# Altium footprint library My_Intlib.PcbLib: 224 footprints (part 1 of 14)
Each footprint in its own frame and in the unit in brackets; x right, y up, seen from the top. Pads: shape width x height; smd on the part's side, far side on the other; paste and mask are expansions set on the pad; w line width, h text height; cw(c..) or ccw(c..) is an arc to the next point about the centre after c.
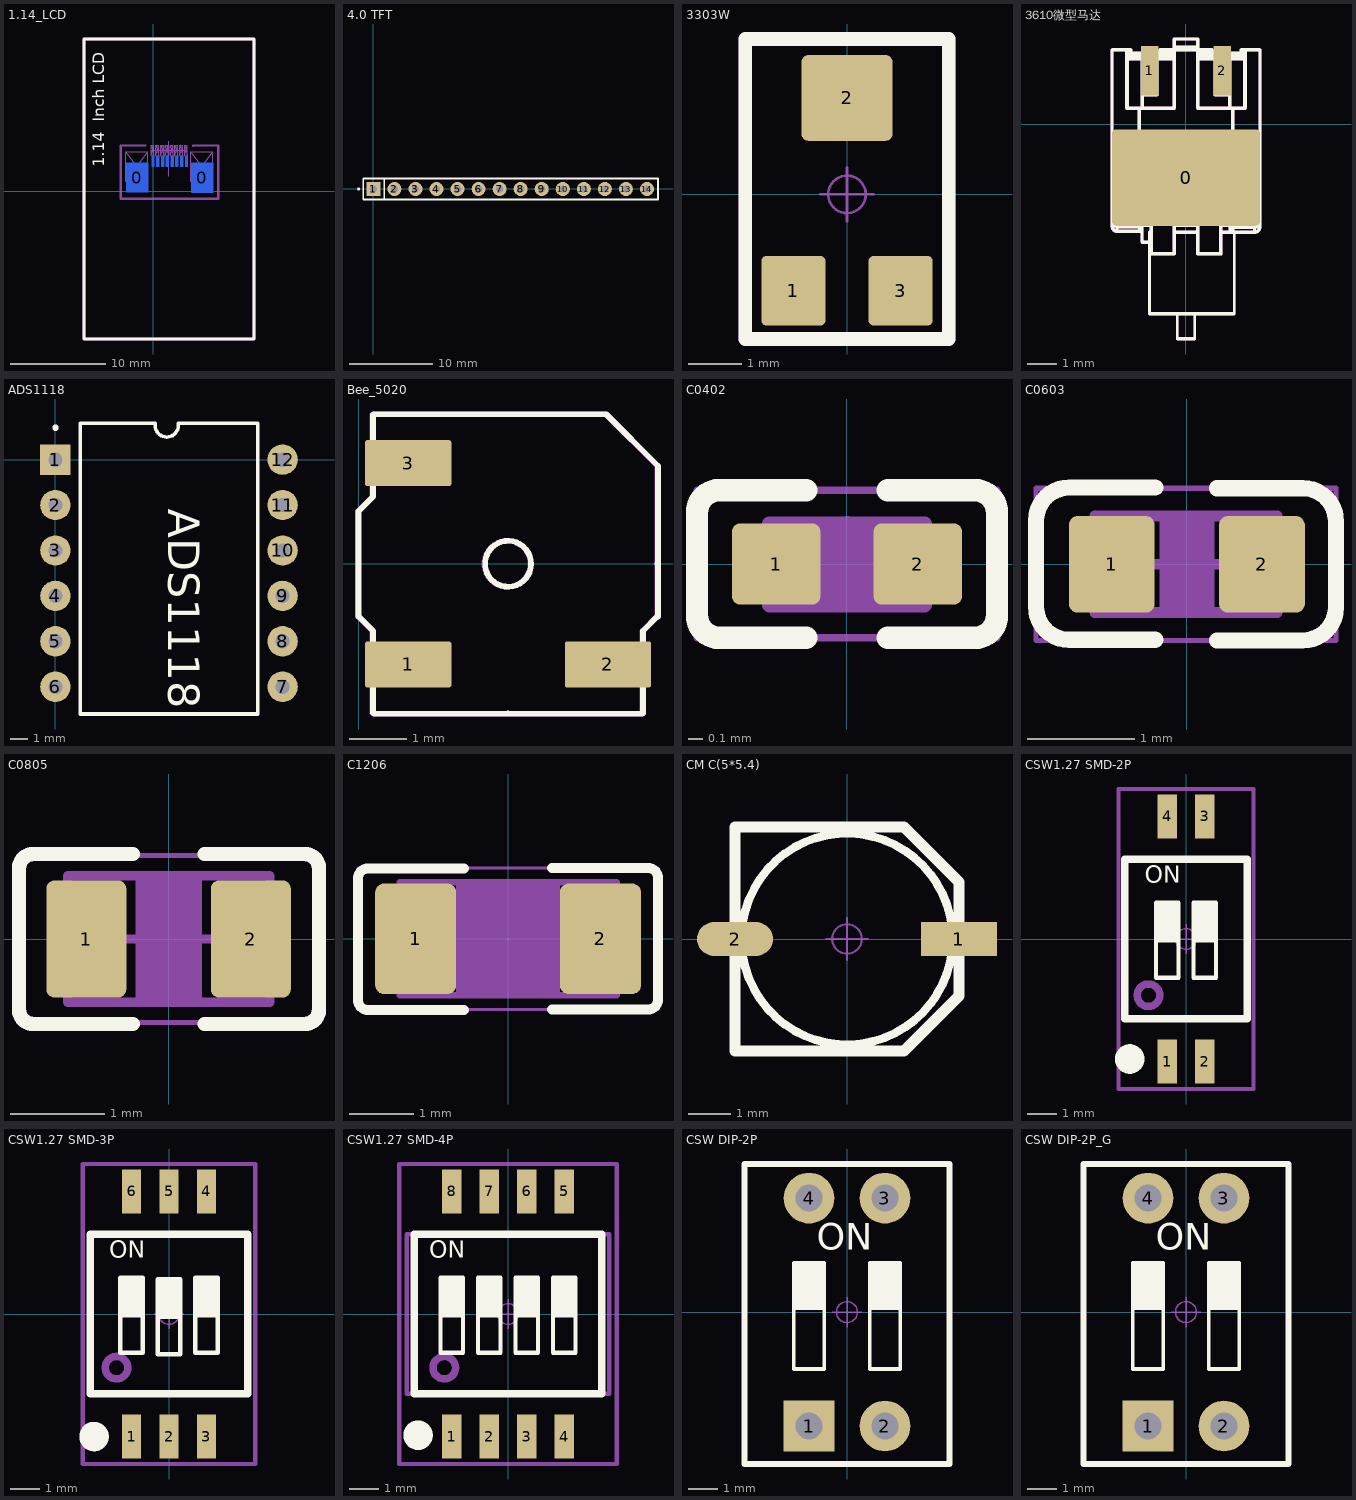
[diagram p0: the footprints below, top view; thin cyan lines are the x and y axes]

## 1.14_LCD [mm]
pads (10):
  rrect5% 2.3x3.1 smd far side mask+0.07: 0(-1.672,1.401) 0(5.172,1.396)
  rrect20% 0.3x1.1 smd far side mask+0.07: 1(0,3.099) 2(0.5,3.099) 3(1,3.099) 4(1.5,3.099) 5(2,3.099) 6(2.5,3.099) 7(3,3.099) 8(3.5,3.099)
Top Overlay:
  lines w0.305: -7.2,-15.469 10.544,-15.469 ; -7.2,-15.433 -7.2,15.9 10.544,15.9 10.544,-15.433
  text "1.14  Inch LCD" at -4.679,2.565 h2.03
Bottom Overlay:
  lines w0.254: -0.813,4.766 -3.353,4.766 -3.353,-0.822 6.807,-0.822 6.807,4.766 4.209,4.761
Top Value:
  text ".Comment" at 0.076,1.793 h0.89
Top Assembly:
  lines w0.254: -0.813,4.766 -3.353,4.766 -3.353,-0.822 6.807,-0.822 6.807,4.766 4.209,4.761
  lines w0.305: -7.2,-15.469 10.544,-15.469 ; -7.2,-15.433 -7.2,15.9 10.544,15.9 10.544,-15.433
  text ".Designator" at 0.076,2.586 h0.89
Mechanical 15:
  circle w0.006: c1.75,3.099 r0.003
  circle w0.006: c0,3.099 r0.003
  circle w0.006: c5.17,1.399 r0.003
  circle w0.006: c-1.67,1.399 r0.003
  lines w0.013: -0.201,4.258 3.599,4.258 ; 1.662,1.558 1.662,5.199 ; -2.871,1.008 -0.571,4.108 ; -2.871,1.008 -0.571,1.008 ; -2.871,1.008 -2.871,4.108 ; -2.871,4.108 -0.571,1.008 ; -2.871,4.108 -0.571,4.108 ; -0.571,1.008 -0.571,4.108 ; -0.201,3.708 0.099,3.708 ; -0.201,3.708 0.099,4.808 ; -0.201,3.708 -0.201,4.808 ; -0.201,4.808 0.099,4.808 ; -0.201,4.808 0.099,3.708 ; 0.099,3.708 0.099,4.808 ; 0.299,3.708 0.299,4.808 ; 0.299,3.708 0.599,4.808 ; 0.299,3.708 0.599,3.708 ; 0.299,4.808 0.599,3.708 ; 0.299,4.808 0.599,4.808 ; 0.599,3.708 0.599,4.808 ; 0.799,3.708 1.099,3.708 ; 0.799,3.708 1.099,4.808 ; 0.799,3.708 0.799,4.808 ; 0.799,4.808 1.099,4.808 ; 0.799,4.808 1.099,3.708 ; 1.099,3.708 1.099,4.808 ; 1.299,3.708 1.599,4.808 ; 1.299,3.708 1.599,3.708 ; 1.299,3.708 1.299,4.808 ; 1.299,4.808 1.599,4.808 ; 1.299,4.808 1.599,3.708 ; 1.599,3.708 1.599,4.808 ; 1.799,3.708 1.799,4.808 ; 1.799,3.708 2.099,3.708 ; 1.799,3.708 2.099,4.808 ; 1.799,4.808 2.099,4.808 ; 1.799,4.808 2.099,3.708 ; 2.099,3.708 2.099,4.808 ; 2.299,3.708 2.299,4.808 ; 2.299,3.708 2.599,4.808 ; 2.299,3.708 2.599,3.708 ; 2.299,4.808 2.599,4.808 ; 2.299,4.808 2.599,3.708 ; 2.599,3.708 2.599,4.808 ; 2.799,3.708 3.099,4.808 ; 2.799,3.708 3.099,3.708 ; 2.799,3.708 2.799,4.808 ; 2.799,4.808 3.099,3.708 ; 2.799,4.808 3.099,4.808 ; 3.099,3.708 3.099,4.808 ; 3.299,3.708 3.599,3.708 ; 3.299,3.708 3.299,4.808 ; 3.299,3.708 3.599,4.808 ; 3.299,4.808 3.599,3.708 ; 3.299,4.808 3.599,4.808 ; 3.599,3.708 3.599,4.808 ; 3.969,1.008 3.969,4.108 ; 3.969,1.008 6.269,4.108 ; 3.969,1.008 6.269,1.008 ; 3.969,4.108 6.269,4.108 ; 3.969,4.108 6.269,1.008 ; 6.269,1.008 6.269,4.108
3D body "1.14寸LCD.STEP": height 1.75, standoff -3.61, extent -7.198,-19.221 10.602,15.93

## 4.0 TFT [mm]
pads (14):
  rect 1.7x1.7 hole 0.9: 1(0,0)
  round 1.7 hole 0.9: 2(2.54,0) 3(5.08,0) 4(7.62,0) 5(10.16,0) 6(12.7,0) 7(15.24,0) 8(17.78,0) 9(20.32,0) 10(22.86,0) 11(25.4,0) 12(27.94,0) 13(30.48,0) 14(33.02,0)
Top Overlay:
  circle w0.203: c-1.778,0 r0.076
  lines w0.2: 1.313,-1.25 1.313,1.25 ; -1.206,-1.27 34.353,-1.27 34.353,1.27 0.699,1.27 -1.206,1.27 -1.206,-1.27
3D body "HDR2.54-1P.STEP": height 14.1, standoff 2.6, extent -1.143,-1.27 1.397,1.27
3D body "HDR2.54-1P.STEP": height 14.1, standoff 2.6, extent 6.477,-1.27 9.017,1.27
3D body "HDR2.54-1P.STEP": height 14.1, standoff 2.6, extent 3.937,-1.27 6.477,1.27
3D body "HDR2.54-1P.STEP": height 14.1, standoff 2.6, extent 14.097,-1.27 16.637,1.27
3D body "HDR2.54-1P.STEP": height 14.1, standoff 2.6, extent 11.557,-1.27 14.097,1.27
3D body "HDR2.54-1P.STEP": height 14.1, standoff 2.6, extent 19.177,-1.27 21.717,1.27
3D body "HDR2.54-1P.STEP": height 14.1, standoff 2.6, extent 21.717,-1.27 24.257,1.27
3D body "HDR2.54-1P.STEP": height 14.1, standoff 2.6, extent 24.257,-1.27 26.797,1.27
3D body "HDR2.54-1P.STEP": height 14.1, standoff 2.6, extent 31.877,-1.27 34.417,1.27
3D body "HDR2.54-1P.STEP": height 14.1, standoff 2.6, extent 29.337,-1.27 31.877,1.27
3D body "HDR2.54-1P.STEP": height 14.1, standoff 2.6, extent 1.397,-1.27 3.937,1.27
3D body "HDR2.54-1P.STEP": height 14.1, standoff 2.6, extent 9.017,-1.27 11.557,1.27
3D body "HDR2.54-1P.STEP": height 14.1, standoff 2.6, extent 16.637,-1.27 19.177,1.27
3D body "HDR2.54-1P.STEP": height 14.1, standoff 2.6, extent 26.797,-1.27 29.337,1.27
3D body "HDR2.54-1P_M.STEP": height 8.5, standoff -3, extent 19.177,-1.27 21.717,1.27
3D body "HDR2.54-1P_M.STEP": height 8.5, standoff -3, extent 16.637,-1.27 19.177,1.27
3D body "HDR2.54-1P_M.STEP": height 8.5, standoff -3, extent 14.097,-1.27 16.637,1.27
3D body "HDR2.54-1P_M.STEP": height 8.5, standoff -3, extent 11.557,-1.27 14.097,1.27
3D body "HDR2.54-1P_M.STEP": height 8.5, standoff -3, extent 9.017,-1.27 11.557,1.27
3D body "HDR2.54-1P_M.STEP": height 8.5, standoff -3, extent 6.477,-1.27 9.017,1.27
3D body "HDR2.54-1P_M.STEP": height 8.5, standoff -3, extent 3.937,-1.27 6.477,1.27
3D body "HDR2.54-1P_M.STEP": height 8.5, standoff -3, extent 1.397,-1.27 3.937,1.27
3D body "HDR2.54-1P_M.STEP": height 8.5, standoff -3, extent -1.143,-1.27 1.397,1.27
3D body "HDR2.54-1P_M.STEP": height 8.5, standoff -3, extent 21.717,-1.27 24.257,1.27
3D body "HDR2.54-1P_M.STEP": height 8.5, standoff -3, extent 24.257,-1.27 26.797,1.27
3D body "HDR2.54-1P_M.STEP": height 8.5, standoff -3, extent 26.797,-1.27 29.337,1.27
3D body "HDR2.54-1P_M.STEP": height 8.5, standoff -3, extent 29.337,-1.27 31.877,1.27
3D body "HDR2.54-1P_M.STEP": height 8.5, standoff -3, extent 31.877,-1.27 34.417,1.27
3D body "1.STEP": height 15.46, standoff 11.36, extent -14.182,-106.135 47.558,1.905

## 3303W [mm] "3.5*3.1*1.5mm"
pads (3):
  rrect15% 1.2x1.3 smd: 1(-1,-1.8) 3(1,-1.8)
  rrect15% 1.7x1.6 smd: 2(0,1.8)
Top Overlay:
  lines w0.254: -1.9,-2.7 -1.9,2.9 1.9,2.9 1.9,-2.7 -1.9,-2.7
Top Value:
  text ".Comment" at 2.718,-0.635 h0.89
Top Assembly:
  lines w0.254: -1.9,-2.7 -1.9,2.9 1.9,2.9 1.9,-2.7 -1.9,-2.7
  text ".Designator" at 2.692,0.305 h0.89
Mechanical 15:
  circle w0.05: c0,0 r0.35
  lines w0.05: -0.5,0 0.5,0 ; 0,-0.5 0,0.5
3D body "3303W.STEP": height 1.45, standoff -0.01, extent -1.55,-2.055 1.55,2.05

## 3610微型马达 [mm] "3610微型马达，10.6mm*4.4mm*3.5mm"
pads (3):
  rrect10% 5.08x3.302 smd: 0(0,-1.826)
  rrect10% 0.6x1.7 smd: 1(-1.24,1.826) 2(1.24,1.826)
Top Overlay:
  drawing of 2290 lines, arcs and shapes, not listed
Top Value:
  text ".Comment" at 2.769,-0.024 h0.89
Top Assembly:
  text ".Designator" at 2.769,0.769 h0.89
Mechanical 15:
  drawing of 2290 lines, arcs and shapes, not listed
3D body "3610微型马达.STEP": height 3.87, standoff 0.02, extent -2.528,-7.363 2.54,2.903

## ADS1118 [mm]
pads (12):
  rect 1.7x1.7 hole 0.8: 1(0,0)
  round 1.7 hole 0.8: 2(0,-2.54) 3(0,-5.08) 4(0,-7.62) 5(0,-10.16) 6(0,-12.7) 7(12.7,-12.7) 8(12.7,-10.16) 9(12.7,-7.62) 10(12.7,-5.08) 11(12.7,-2.54) 12(12.7,0)
Top Overlay:
  circle w0.203: c0,1.778 r0.076
  lines w0.2: 5.588,2.016 ccw(c6.223,1.905) 6.858,2.016 ; 5.588,2.042 1.397,2.042 1.397,-14.224 11.303,-14.224 11.303,2.031 6.858,2.031
  text "ADS1118" at 5.715,-2.751 h3
3D body "HDR2.54-1P_M.STEP": height 8.5, standoff -3, extent 11.43,-8.89 13.97,-6.35
3D body "HDR2.54-1P_M.STEP": height 8.5, standoff -3, extent 11.43,-13.97 13.97,-11.43
3D body "HDR2.54-1P_M.STEP": height 8.5, standoff -3, extent 11.43,-11.43 13.97,-8.89
3D body "HDR2.54-1P_M.STEP": height 8.5, standoff -3, extent 11.43,-1.27 13.97,1.27
3D body "HDR2.54-1P_M.STEP": height 8.5, standoff -3, extent 11.43,-6.35 13.97,-3.81
3D body "HDR2.54-1P_M.STEP": height 8.5, standoff -3, extent 11.43,-3.81 13.97,-1.27
3D body "HDR2.54-1P_M.STEP": height 8.5, standoff -3, extent -1.27,-8.89 1.27,-6.35
3D body "HDR2.54-1P_M.STEP": height 8.5, standoff -3, extent -1.27,-13.97 1.27,-11.43
3D body "HDR2.54-1P_M.STEP": height 8.5, standoff -3, extent -1.27,-11.43 1.27,-8.89
3D body "HDR2.54-1P_M.STEP": height 8.5, standoff -3, extent -1.27,-1.27 1.27,1.27
3D body "HDR2.54-1P_M.STEP": height 8.5, standoff -3, extent -1.27,-6.35 1.27,-3.81
3D body "HDR2.54-1P_M.STEP": height 8.5, standoff -3, extent -1.27,-3.81 1.27,-1.27

## Bee_5020 [mm]
pads (3):
  rrect10% 1.5x0.8 smd mask+0.102: 1(0.864,-1.75) 2(4.336,-1.75) 3(0.864,1.75)
Top Overlay:
  circle w0.1: c0.711,-1.753 r0.227
  circle w0.1: c2.6,0 r0.4
  region: 0.484,-1.753 0.484,-1.798 0.519,-1.881 0.583,-1.945 0.666,-1.98 0.711,-1.98 0.756,-1.98 0.84,-1.945 0.904,-1.881 0.938,-1.798 0.938,-1.753 0.938,-1.707 0.904,-1.624 0.84,-1.56 0.756,-1.525 0.711,-1.525 0.666,-1.525 0.583,-1.56 0.519,-1.624 0.484,-1.707
  lines w0.102: 0.254,2.591 0.254,1.168 0,0.914 0,-0.914 0.254,-1.168 0.254,-2.591 0.27,-2.607 1.693,-2.607 4.937,-2.607 4.946,-2.598 4.946,-1.168 5.2,-0.914 ; 0.263,2.6 4.309,2.6 5.207,1.702 5.207,-0.914 ; 2.6,-2.6 2.607,-2.607 ; 5.2,0 5.207,-0.007
Top Value:
  text ".Comment" at 2.134,0.024 h0.89
Top Assembly:
  circle w0.1: c0.702,-1.753 r0.227
  circle w0.1: c2.591,0 r0.4
  region: 0.475,-1.753 0.475,-1.798 0.509,-1.881 0.573,-1.945 0.657,-1.98 0.702,-1.98 0.747,-1.98 0.831,-1.945 0.895,-1.881 0.929,-1.798 0.929,-1.753 0.929,-1.707 0.895,-1.624 0.831,-1.56 0.747,-1.525 0.702,-1.525 0.657,-1.525 0.573,-1.56 0.509,-1.624 0.475,-1.707
  lines w0.102: 0.245,2.591 0.245,1.168 -0.009,0.914 -0.009,-0.914 0.245,-1.168 0.245,-2.591 0.261,-2.607 1.683,-2.607 4.928,-2.607 4.937,-2.598 4.937,-1.168 5.191,-0.914 ; 0.254,2.6 4.3,2.6 5.198,1.702 5.198,-0.914 ; 2.591,-2.6 2.598,-2.607 ; 5.191,0 5.198,-0.007
  text ".Designator" at 2.134,0.818 h0.89
3D body "User Library-BEEP-5020.step": height 2.1, standoff 0, extent 0.016,-2.625 5.216,2.575

## C0402 [mm]
pads (2):
  rrect20% 0.6x0.55 smd mask+0.051: 1(-0.48,0) 2(0.48,0)
Top Overlay:
  lines w0.152: -0.275,-0.5 -0.864,-0.5 cw(c-0.864,-0.348) -1.016,-0.348 -1.016,0.348 cw(c-0.864,0.348) -0.864,0.5 -0.275,0.5 ; 0.275,-0.5 0.864,-0.5 ccw(c0.864,-0.348) 1.016,-0.348 1.016,0.348 ccw(c0.864,0.348) 0.864,0.5 0.275,0.5
Mechanical 1:
  pour cut-out: -0.254,0.272 0.254,0.272 0.254,-0.278 -0.254,-0.278
Top Value:
  text ".Comment" at -0.5,-0.762 h0.76
Top Assembly:
  lines w0.1: -0.525,-0.278 0.525,-0.278 0.525,0.272 -0.525,0.272 -0.525,-0.278
  text ".Designator" at -0.525,-0.22 h0.76
Mechanical 15:
  lines w0.05: -1.016,-0.5 -1.016,0.5 1.016,0.5 1.016,-0.5 -1.016,-0.5
  lines w0.1: -0.275,0 0.275,0 ; 0,-0.275 0,0.275
3D body "C0402.stp": height 0.56, standoff 0.01, extent -0.5,-0.25 0.5,0.25

## C0603 [mm]
pads (2):
  rrect20% 0.8x0.9 smd: 1(-0.7,0) 2(0.7,0)
Top Overlay:
  lines w0.152: -0.296,-0.704 -1.096,-0.704 cw(c-1.096,-0.394) -1.406,-0.394 -1.405,0.406 cw(c-1.096,0.406) -1.096,0.715 -0.296,0.715 ; 0.28,-0.71 1.08,-0.71 ccw(c1.08,-0.4) 1.39,-0.4 1.39,0.4 ccw(c1.08,0.4) 1.08,0.71 0.28,0.71
Mechanical 1:
  pour cut-out: -0.254,0.45 0.254,0.45 0.254,-0.45 -0.254,-0.45
Top Value:
  text ".Comment" at -0.45,-1.144 h0.89
Top Assembly:
  lines w0.1: -0.858,-0.45 -0.858,0.45 0.842,0.45 0.842,-0.45 -0.858,-0.45
  text ".Designator" at -0.45,-0.275 h0.89
Mechanical 15:
  lines w0.05: -1.405,-0.71 1.39,-0.71 1.39,0.71 -1.405,0.71 -1.405,-0.71
  lines w0.1: -0.45,0 0.45,0 ; 0,-0.45 0,0.45
3D body "C0603.stp": height 0.9, standoff 0, extent -0.808,-0.399 0.792,0.401

## C0805 [mm]
pads (2):
  rrect20% 0.85x1.25 smd: 1(-0.875,0) 2(0.875,0)
Top Overlay:
  lines w0.152: -0.381,-0.904 -1.439,-0.904 cw(c-1.439,-0.751) -1.592,-0.751 -1.592,0.751 cw(c-1.439,0.751) -1.439,0.904 -0.381,0.904 ; 0.381,-0.904 1.422,-0.904 ; 0.381,0.904 1.456,0.904 ; 1.448,-0.904 ccw(c1.448,-0.751) 1.6,-0.751 1.6,0.751 ccw(c1.448,0.751) 1.448,0.904
Mechanical 1:
  pour cut-out: -0.351,0.675 0.353,0.675 0.353,-0.675 -0.351,-0.675
Top Value:
  text ".Comment" at -0.762,-1.144 h0.89
Top Assembly:
  lines w0.1: -1.075,-0.675 -1.075,0.675 1.075,0.675 1.075,-0.675 -1.075,-0.675
  text ".Designator" at -0.762,-0.275 h0.89
Mechanical 15:
  lines w0.05: 1.6,-0.889 -1.592,-0.889 -1.592,0.889 1.6,0.889 1.6,-0.864
  lines w0.1: -0.5,0 0.5,0 ; 0,-0.5 0,0.5
3D body "C0805.stp": height 1.41, standoff 0.01, extent -1,-0.623 1,0.627

## C1206 [mm]
pads (2):
  rrect20% 1.25x1.7 smd mask+0.102: 1(-1.425,0) 2(1.425,0)
Top Overlay:
  lines w0.152: -0.678,-1.1 -2.163,-1.1 cw(c-2.163,-0.948) -2.316,-0.948 -2.316,0.933 cw(c-2.163,0.933) -2.163,1.085 -0.678,1.085 ; 0.676,-1.093 2.161,-1.093 ccw(c2.161,-0.94) 2.314,-0.94 2.314,0.94 ccw(c2.161,0.94) 2.161,1.093 0.676,1.093
Mechanical 1:
  pour cut-out: -0.8,0.875 0.8,0.875 0.8,-0.875 -0.8,-0.875
Top Value:
  text ".Comment" at -1.016,-1.144 h0.89
Top Assembly:
  lines w0.1: -1.675,-0.875 1.675,-0.875 1.675,0.875 -1.675,0.875 -1.675,-0.875
  text ".Designator" at -1.016,-0.275 h0.89
Mechanical 15:
  lines w0.05: -2.316,1.085 -2.316,-1.093 2.314,-1.093 2.314,1.093 -2.316,1.093
  lines w0.1: -0.5,0 0.5,0 ; 0,-0.5 0,0.5
3D body "C1206.stp": height 1.8, standoff 0, extent -1.6,-0.802 1.6,0.798

## CM C(5*5.4) [mm] "贴片电解电容，直径5mm，高5.4mm"
pads (2):
  rect 1.8x0.8 smd: 1(2.65,0)
  oval 1.8x0.8 smd: 2(-2.65,0)
Top Overlay:
  circle w0.2: c0,0 r2.5
  lines w0.254: -2.65,-2.65 1.35,-2.65 2.65,-1.35 2.65,1.35 1.35,2.65 -2.65,2.65 -2.65,-2.65
Mechanical 15:
  circle w0.05: c0,0 r0.35
  lines w0.05: -0.5,0 0.5,0 ; 0,-0.5 0,0.5
3D body "CM C(5X5.4).STEP": height 5.4, standoff -0.01, extent -2.95,-2.65 2.95,2.65

## CSW1.27 SMD-2P [mm] "长：4.14mm，宽：5.4mm，高：2.3mm"
pads (4):
  rect 0.65x1.5 smd: 1(-0.635,-4.15) 2(0.635,-4.15) 3(0.635,4.15) 4(-0.635,4.15)
Top Overlay:
  circle w0.5: c-1.905,-4.064 r0.25
  region: -0.254,1.225 -1.016,1.225 -1.016,-0.045 -0.254,-0.045
  region: 1.016,1.225 0.254,1.225 0.254,-0.045 1.016,-0.045
  lines w0.15: -1.016,-0.045 -0.254,-0.045 ; 0.254,-0.045 1.016,-0.045 ; -1.016,-1.315 -0.254,-1.315 -0.254,1.225 -1.016,1.225 -1.016,-1.315 ; 0.254,-1.315 1.016,-1.315 1.016,1.225 0.254,1.225 0.254,-1.315
  lines w0.254: -2.07,-2.7 -2.07,2.7 2.07,2.7 2.07,-2.7 -2.07,-2.7
  text "ON" at -1.397,1.696 h1
Mechanical 13:
  circle w0.254: c-1.27,-1.905 r0.381
  lines w0.15: -2.032,-2.7 2.032,-2.7 2.032,2.7 -2.032,2.7 -2.032,-2.7
Mechanical 15:
  circle w0.05: c0,0 r0.35
  lines w0.05: -0.5,0 0.5,0 ; 0,-0.5 0,0.5
  lines w0.15: -2.286,-5.08 2.159,-5.08 2.286,-5.08 2.286,5.08 -2.286,5.08 -2.286,-5.08
3D body "CSW1.27-SMD-2P.STEP": height 2.35, standoff 0, extent -2.07,-4.35 2.07,4.35

## CSW1.27 SMD-3P [mm] "长：5.41mm，宽：5.4mm，高：2.3mm"
pads (6):
  rect 0.65x1.5 smd: 1(-1.27,-4.15) 2(0,-4.15) 3(1.27,-4.15) 4(1.27,4.15) 5(0,4.15) 6(-1.27,4.15)
Top Overlay:
  circle w0.5: c-2.54,-4.15 r0.25
  region: 1.651,1.225 0.889,1.225 0.889,-0.045 1.651,-0.045
  region: 0.381,1.184 -0.381,1.184 -0.381,-0.086 0.381,-0.086
  region: -0.889,1.225 -1.651,1.225 -1.651,-0.045 -0.889,-0.045
  lines w0.15: -1.651,-0.045 -0.889,-0.045 ; -0.381,-0.086 0.381,-0.086 ; 0.889,-0.045 1.651,-0.045 ; -1.651,-1.315 -1.651,1.225 -0.889,1.225 -0.889,-1.315 -1.651,-1.315 ; -0.381,-1.356 -0.381,1.184 0.381,1.184 0.381,-1.356 -0.381,-1.356 ; 0.889,-1.315 0.889,1.225 1.651,1.225 1.651,-1.315 0.889,-1.315
  lines w0.254: -2.667,-2.7 2.667,-2.7 2.667,2.7 -2.667,2.7 -2.667,-2.7
  text "ON" at -2.032,1.696 h1
Mechanical 13:
  circle w0.254: c-1.778,-1.819 r0.381
  lines w0.15: -2.667,-2.7 -2.667,2.7 2.705,2.7 2.705,-2.7 -2.667,-2.7
Mechanical 15:
  circle w0.05: c0,0 r0.35
  lines w0.05: -0.5,0 0.5,0 ; 0,-0.5 0,0.5
  lines w0.15: -2.921,-5.08 -2.921,5.08 2.921,5.08 2.921,-5.08 2.159,-5.08 -2.921,-5.08
3D body "CSW1.27-SMD-3P.STEP": height 2.35, standoff 0, extent -2.705,-4.35 2.705,4.35

## CSW1.27 SMD-4P [mm] "长：6.68mm，宽：5.4mm，高：2.3mm"
pads (8):
  rect 0.65x1.5 smd: 1(-1.905,-4.15) 2(-0.635,-4.15) 3(0.635,-4.15) 4(1.905,-4.15) 5(1.905,4.15) 6(0.635,4.15) 7(-0.635,4.15) 8(-1.905,4.15)
Top Overlay:
  circle w0.5: c-3.048,-4.105 r0.25
  region: -1.524,1.225 -2.286,1.225 -2.286,-0.045 -1.524,-0.045
  region: -0.254,1.225 -1.016,1.225 -1.016,-0.045 -0.254,-0.045
  region: 1.016,1.225 0.254,1.225 0.254,-0.045 1.016,-0.045
  region: 2.286,1.225 1.524,1.225 1.524,-0.045 2.286,-0.045
  lines w0.15: -2.286,-0.045 -1.524,-0.045 ; -1.016,-0.045 -0.254,-0.045 ; 0.254,-0.045 1.016,-0.045 ; 1.524,-0.045 2.286,-0.045 ; -2.286,-1.315 -1.524,-1.315 -1.524,1.225 -2.286,1.225 -2.286,-1.315 ; -1.016,-1.315 -0.254,-1.315 -0.254,1.225 -1.016,1.225 -1.016,-1.315 ; 0.254,-1.315 1.016,-1.315 1.016,1.225 0.254,1.225 0.254,-1.315 ; 1.524,-1.315 2.286,-1.315 2.286,1.225 1.524,1.225 1.524,-1.315
  lines w0.254: -3.175,-2.7 -3.175,2.7 3.175,2.7 3.175,-2.7 -3.175,-2.7
  text "ON" at -2.667,1.696 h1
Mechanical 13:
  circle w0.254: c-2.159,-1.819 r0.381
  lines w0.15: -3.429,-2.7 3.429,-2.7 3.429,2.7 -3.429,2.7 -3.429,-2.7
Mechanical 15:
  circle w0.05: c0,0 r0.35
  lines w0.05: -0.5,0 0.5,0 ; 0,-0.5 0,0.5
  lines w0.15: -3.683,-5.08 2.159,-5.08 3.683,-5.08 3.683,5.08 -3.683,5.08 -3.683,-5.08
3D body "CSW1.27-SMD-4P.STEP": height 2.35, standoff 0, extent -3.34,-4.35 3.34,4.35

## CSW DIP-2P [mm] "6.6*9.9*7mm"
pads (4):
  rect 1.7x1.7 hole 0.9: 1(-1.27,-3.81)
  round 1.7 hole 0.9: 2(1.27,-3.81) 3(1.27,3.81) 4(-1.27,3.81)
Top Overlay:
  rectangle: 0.762,0.127 1.778,1.651
  rectangle: -1.778,0.127 -0.762,1.651
  lines w0.127: -1.778,0.127 -0.762,0.127 ; 0.762,0.127 1.778,0.127 ; -1.778,-1.905 -0.762,-1.905 -0.762,1.651 -1.778,1.651 -1.778,-1.905 ; 0.762,-1.905 1.778,-1.905 1.778,1.651 0.762,1.651 0.762,-1.905
  lines w0.2: -3.429,-5.08 3.429,-5.08 3.429,4.953 -3.429,4.953 -3.429,-5.08
  text "ON" at -1.016,1.778 h1.52
Mechanical 15:
  circle w0.05: c0,0 r0.35
  lines w0.05: -0.5,0 0.5,0 ; 0,-0.5 0,0.5
3D body "CSW DIP-2P.STEP": height 6.65, standoff -3.15, extent -3.32,-4.95 3.32,4.95

## CSW DIP-2P_G [mm] "6.6*9.9*7mm"
pads (4):
  rect 1.7x1.7 hole 0.9: 1(-1.27,-3.81)
  round 1.7 hole 0.9: 2(1.27,-3.81) 3(1.27,3.81) 4(-1.27,3.81)
Top Overlay:
  rectangle: 0.762,0.127 1.778,1.651
  rectangle: -1.778,0.127 -0.762,1.651
  lines w0.127: -1.778,0.127 -0.762,0.127 ; 0.762,0.127 1.778,0.127 ; -1.778,-1.905 -0.762,-1.905 -0.762,1.651 -1.778,1.651 -1.778,-1.905 ; 0.762,-1.905 1.778,-1.905 1.778,1.651 0.762,1.651 0.762,-1.905
  lines w0.2: -3.429,-5.08 3.429,-5.08 3.429,4.953 -3.429,4.953 -3.429,-5.08
  text "ON" at -1.016,1.778 h1.52
Mechanical 15:
  circle w0.05: c0,0 r0.35
  lines w0.05: -0.5,0 0.5,0 ; 0,-0.5 0,0.5
3D body "CSW DIP-2P_G.STEP": height 6.65, standoff -3.15, extent -3.32,-4.95 3.32,4.95